# Altium footprint library PcbLib.PcbLib: 428 footprints (part 2 of 27)
Each footprint in its own frame and in the unit in brackets; x right, y up, seen from the top. Pads: shape width x height; smd on the part's side, far side on the other; paste and mask are expansions set on the pad; w line width, h text height; cw(c..) or ccw(c..) is an arc to the next point about the centre after c.
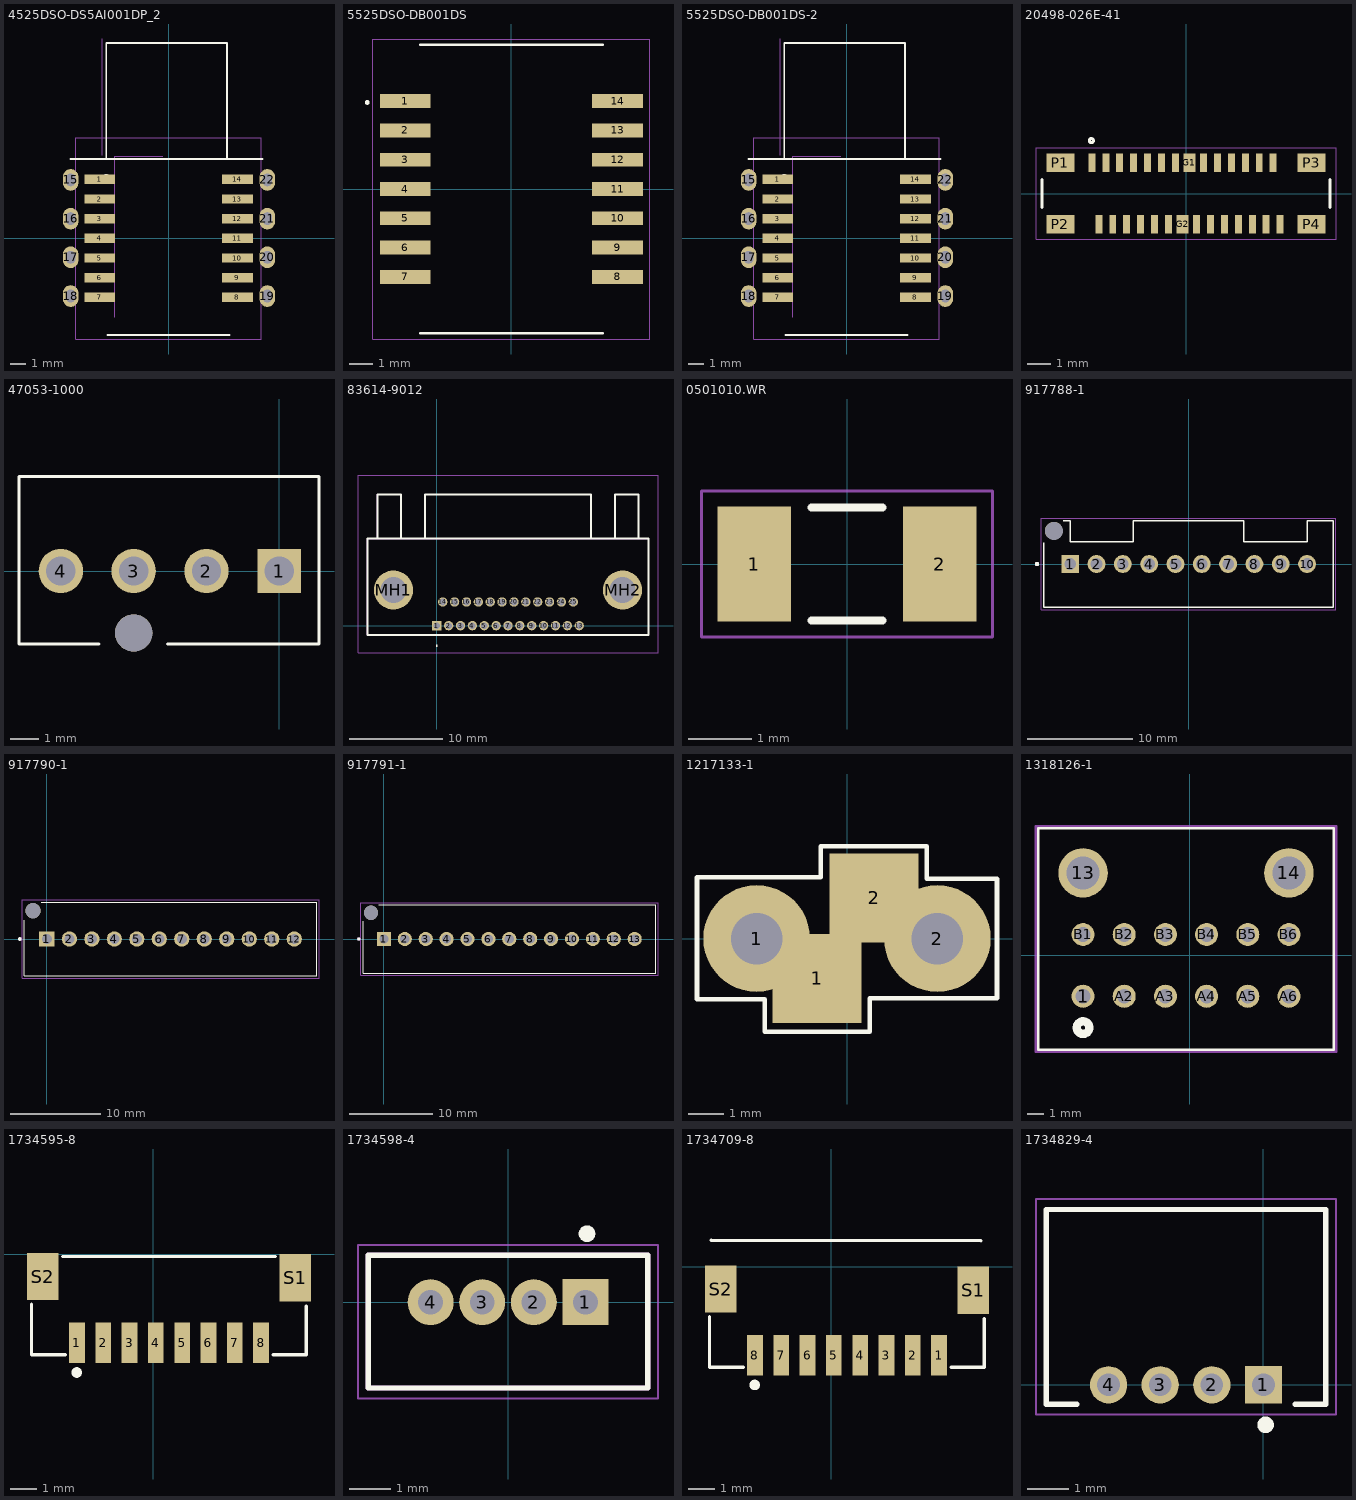
[diagram p1: the footprints below, top view; thin cyan lines are the x and y axes]

## 4525DSO-DS5AI001DP_2 [mm]
pads (22):
  rect 2x0.6 smd: 1(-4.448,3.81) 2(-4.448,2.54) 3(-4.448,1.27) 4(-4.448,0) 5(-4.448,-1.27) 6(-4.448,-2.54) 7(-4.448,-3.81) 8(4.448,-3.81) 9(4.448,-2.54) 10(4.448,-1.27) 11(4.448,0) 12(4.448,1.27) 13(4.448,2.54) 14(4.448,3.81)
  oval 1x1.4 hole 0.6 slot 0.8 at 90 deg: 15(-6.325,3.775) 16(-6.325,1.275) 17(-6.325,-1.225) 18(-6.325,-3.725) 19(6.375,-3.725) 20(6.375,-1.225) 21(6.375,1.275) 22(6.375,3.775)
Top Overlay:
  circle w0.3: c-4.041,3.902 r0.1
  circle w0.1: c-6.25,3.75 r0.05
  lines w0.127: -6.352,5.128 -4.052,5.128 ; -3.95,-6.25 3.95,-6.25 ; 6.073,5.128 3.773,5.128 ; 3.773,5.128 3.773,12.628 -4.027,12.628 -4.027,5.128 3.773,5.128
Mechanical 15:
  lines w0.05: -4.277,5.378 -4.277,12.878 ; -3.491,-5.098 -3.491,5.302 -0.391,5.302 ; -6,-6.5 6,-6.5 6,6.5 -6,6.5 -6,-6.5
3D body "4525DO-DS5AI001DP.STEP": height 8.93, standoff -2.76, extent -6.477,-4.775 6.477,12.702

## 5525DSO-DB001DS [mm]
pads (14):
  rect 2.2x0.6 smd: 1(-4.6,3.81) 2(-4.6,2.54) 3(-4.6,1.27) 4(-4.6,0) 5(-4.6,-1.27) 6(-4.6,-2.54) 7(-4.6,-3.81) 8(4.6,-3.81) 9(4.6,-2.54) 10(4.6,-1.27) 11(4.6,0) 12(4.6,1.27) 13(4.6,2.54) 14(4.6,3.81)
Top Overlay:
  circle w0.1: c-6.25,3.75 r0.05
  lines w0.127: -3.95,-6.25 3.95,-6.25 ; -3.95,6.25 3.95,6.25
Mechanical 15:
  lines w0.05: -6,-6.5 -6,6.5 6,6.5 6,-6.5 -6,-6.5
3D body "step_temp.STEP": height 9.68, standoff 0, extent -5.16,-6.226 5.16,6.274

## 5525DSO-DB001DS-2 [mm]
pads (22):
  rect 2x0.6 smd: 1(-4.448,3.81) 2(-4.448,2.54) 3(-4.448,1.27) 4(-4.448,0) 5(-4.448,-1.27) 6(-4.448,-2.54) 7(-4.448,-3.81) 8(4.448,-3.81) 9(4.448,-2.54) 10(4.448,-1.27) 11(4.448,0) 12(4.448,1.27) 13(4.448,2.54) 14(4.448,3.81)
  oval 1x1.4 hole 0.6 slot 0.8 at 90 deg: 15(-6.325,3.775) 16(-6.325,1.275) 17(-6.325,-1.225) 18(-6.325,-3.725) 19(6.375,-3.725) 20(6.375,-1.225) 21(6.375,1.275) 22(6.375,3.775)
Top Overlay:
  circle w0.3: c-4.041,3.902 r0.1
  circle w0.1: c-6.25,3.75 r0.05
  lines w0.127: -6.352,5.128 -4.052,5.128 ; -3.95,-6.25 3.95,-6.25 ; 6.073,5.128 3.773,5.128 ; 3.773,5.128 3.773,12.628 -4.027,12.628 -4.027,5.128 3.773,5.128
Mechanical 15:
  lines w0.05: -4.277,5.378 -4.277,12.878 ; -3.491,-5.098 -3.491,5.302 -0.391,5.302 ; -6,-6.5 6,-6.5 6,6.5 -6,6.5 -6,-6.5
3D body "step_temp.STEP": height 9.68, standoff 0, extent -5.16,-6.226 5.16,6.274

## 20498-026E-41 [mm]
pads (32):
  rect 0.3x0.8 smd paste-1: 1(-4.05,1.32) 2(-3.75,-1.32) 3(-3.45,1.32) 4(-3.15,-1.32) 5(-2.85,1.32) 6(-2.55,-1.32) 7(-2.25,1.32) 8(-1.95,-1.32) 9(-1.65,1.32) 10(-1.35,-1.32) 11(-1.05,1.32) 12(-0.75,-1.32) 13(-0.45,1.32) 14(0.45,-1.32) 15(0.75,1.32) 16(1.05,-1.32) 17(1.35,1.32) 18(1.65,-1.32) 19(1.95,1.32) 20(2.25,-1.32) 21(2.55,1.32) 22(2.85,-1.32) 23(3.15,1.32) 24(3.45,-1.32) 25(3.75,1.32) 26(4.05,-1.32)
  rect 0.5x0.8 smd paste-1: G1(0.15,1.32) G2(-0.15,-1.32)
  rect 1.2x0.8 smd paste-2: P1(-5.4,1.32) P2(-5.4,-1.32) P3(5.4,1.32) P4(5.4,-1.32)
Top Overlay:
  circle w0.127: c-4.07,2.28 r0.089
  lines w0.127: -6.2,-0.6 -6.2,0.6 ; 6.2,-0.6 6.2,0.6
Top Paste:
  region: -4.8,1.08 -6,1.08 -6,1.72 -4.8,1.72
  region: -4.8,-1.72 -6,-1.72 -6,-1.08 -4.8,-1.08
  region: -3.9,1.24 -4.2,1.24 -4.2,1.72 -3.9,1.72
  region: -3.6,-1.72 -3.9,-1.72 -3.9,-1.24 -3.6,-1.24
  region: 0.1,-1.72 -0.4,-1.72 -0.4,-1.08 0.1,-1.08
  region: 0.4,1.08 -0.1,1.08 -0.1,1.72 0.4,1.72
  region: -3,-1.72 -3.3,-1.72 -3.3,-1.24 -3,-1.24
  region: -2.4,-1.72 -2.7,-1.72 -2.7,-1.24 -2.4,-1.24
  region: -1.8,-1.72 -2.1,-1.72 -2.1,-1.24 -1.8,-1.24
  region: -1.2,-1.72 -1.5,-1.72 -1.5,-1.24 -1.2,-1.24
  region: -0.6,-1.72 -0.9,-1.72 -0.9,-1.24 -0.6,-1.24
  region: 0.6,-1.72 0.3,-1.72 0.3,-1.24 0.6,-1.24
  region: 1.2,-1.72 0.9,-1.72 0.9,-1.24 1.2,-1.24
  region: 1.8,-1.72 1.5,-1.72 1.5,-1.24 1.8,-1.24
  region: 2.4,-1.72 2.1,-1.72 2.1,-1.24 2.4,-1.24
  region: 3,-1.72 2.7,-1.72 2.7,-1.24 3,-1.24
  region: 3.6,-1.72 3.3,-1.72 3.3,-1.24 3.6,-1.24
  region: 4.2,-1.72 3.9,-1.72 3.9,-1.24 4.2,-1.24
  region: -3.3,1.24 -3.6,1.24 -3.6,1.72 -3.3,1.72
  region: -2.7,1.24 -3,1.24 -3,1.72 -2.7,1.72
  region: -2.1,1.24 -2.4,1.24 -2.4,1.72 -2.1,1.72
  region: -1.5,1.24 -1.8,1.24 -1.8,1.72 -1.5,1.72
  region: -0.9,1.24 -1.2,1.24 -1.2,1.72 -0.9,1.72
  region: -0.3,1.24 -0.6,1.24 -0.6,1.72 -0.3,1.72
  region: 0.9,1.24 0.6,1.24 0.6,1.72 0.9,1.72
  region: 1.5,1.24 1.2,1.24 1.2,1.72 1.5,1.72
  region: 2.1,1.24 1.8,1.24 1.8,1.72 2.1,1.72
  region: 2.7,1.24 2.4,1.24 2.4,1.72 2.7,1.72
  region: 3.3,1.24 3,1.24 3,1.72 3.3,1.72
  region: 3.9,1.24 3.6,1.24 3.6,1.72 3.9,1.72
  region: 6,-1.72 4.8,-1.72 4.8,-1.08 6,-1.08
  region: 6,1.08 4.8,1.08 4.8,1.72 6,1.72
Mechanical 15:
  lines w0.05: -6.45,-1.97 6.45,-1.97 6.45,1.97 -6.45,1.97 -6.45,-1.97
3D body "20498-026E-41--3DModel-STEP-231308.STEP": height 1.24, standoff -0.03, extent -6.2,-1.45 6.2,1.45

## 47053-1000 [mm]
pads (5):
  rect 1.53x1.53 hole 1.02: 1(0,0)
  round 1.55 hole 1.02: 2(-2.54,0) 3(-5.08,0) 4(-7.62,0)
  round 1.3 hole 1.3 unplated: ""(-5.08,-2.16)
Top Overlay:
  lines w0.1: -6.293,-2.54 -9.08,-2.54 -9.08,3.3 1.386,3.3 1.386,-2.54 -3.902,-2.54
3D body "470531000.stp": height 10.5, standoff -3, extent -8.93,-2.54 1.27,3.3

## 83614-9012 [mm]
pads (27):
  rect 1x1 hole 0.71: 1(0,0)
  round 1 hole 0.71: 2(1.27,0) 3(2.54,0) 4(3.81,0) 5(5.08,0) 6(6.35,0) 7(7.62,0) 8(8.89,0) 9(10.16,0) 10(11.43,0) 11(12.7,0) 12(13.97,0) 13(15.24,0) 14(0.635,2.54) 15(1.905,2.54) 16(3.175,2.54) 17(4.445,2.54) 18(5.715,2.54) 19(6.985,2.54) 20(8.255,2.54) 21(9.525,2.54) 22(10.795,2.54) 23(12.065,2.54) 24(13.335,2.54) 25(14.605,2.54)
  round 4.185 hole 2.79: MH1(-4.635,3.81) MH2(19.875,3.81)
Top Overlay:
  lines w0.1: 0,-2.2 ccw(c0,-2.15) 0,-2.1 ccw(c0,-2.15) 0,-2.2
  lines w0.2: -6.35,9.32 -6.35,14.04 -3.81,14.04 -3.81,9.32 ; -1.27,9.32 -1.27,14.04 16.51,14.04 16.51,9.32 ; 19.05,9.32 19.05,14.04 21.59,14.04 21.59,9.32 ; -7.43,-0.98 22.67,-0.98 22.67,9.32 -7.43,9.32 -7.43,-0.98
Mechanical 13:
  lines w0.1: -6.35,9.32 -6.35,14.04 -3.81,14.04 -3.81,9.32 ; -1.27,9.32 -1.27,14.04 16.51,14.04 16.51,9.32 ; 19.05,9.32 19.05,14.04 21.59,14.04 21.59,9.32 ; -7.43,-0.98 22.67,-0.98 22.67,9.32 -7.43,9.32 -7.43,-0.98
Mechanical 15:
  lines w0.1: -8.43,-2.9 23.67,-2.9 23.67,16.1 -8.43,16.1 -8.43,-2.9
3D body "836149012.stp": height 7.91, standoff -2.95, extent -7.41,-1.014 22.689,15.852

## 0501010.WR [mm]
pads (2):
  rect 1.17x1.82 smd: 1(-1.47,0) 2(1.47,0)
Top Overlay:
  lines w0.127: -0.56,-0.9 0.56,-0.9 ; -0.56,0.9 0.56,0.9
Mechanical 15:
  lines w0.05: -2.308,-1.158 2.308,-1.158 2.308,1.158 -2.308,1.158 -2.308,-1.158
3D body "0501010.WR.STEP": height 1.52, standoff 0, extent -1.587,-0.902 1.587,0.902

## 917788-1 [mm]
pads (11):
  rect 1.7x1.7 hole 1.1: 1(-11.25,0)
  round 1.7 hole 1.1: 2(-8.75,0) 3(-6.25,0) 4(-3.75,0) 5(-1.25,0) 6(1.25,0) 7(3.75,0) 8(6.25,0) 9(8.75,0) 10(11.25,0)
  round 1.7 hole 1.7 unplated: ""(-12.8,3.15)
Top Overlay:
  circle w0.2: c-14.4,0 r0.1
  lines w0.127: -13.75,2 -13.75,-4.1 13.75,-4.1 13.75,4.1 11.25,4.1 11.25,2.1 5.25,2.1 5.25,4.1 -5.25,4.1 -5.25,2.1 -11.25,2.1 -11.25,4.1 -11.9,4.1
Mechanical 13:
  circle w0.2: c-14.4,0 r0.1
Mechanical 15:
  lines w0.05: -14,-4.35 14,-4.35 14,4.35 -14,4.35 -14,-4.35
3D body "c-917788-1-j-3d.stp": height 10.1, standoff -2.9, extent -13.75,-4.1 13.75,4.1

## 917790-1 [mm]
pads (13):
  rect 1.7x1.7 hole 1.1: 1(0,0)
  round 1.7 hole 1.1: 2(2.5,0) 3(5,0) 4(7.5,0) 5(10,0) 6(12.5,0) 7(15,0) 8(17.5,0) 9(20,0) 10(22.5,0) 11(25,0) 12(27.5,0)
  round 1.7 hole 1.7 unplated: ""(-1.55,3.15)
Top Overlay:
  circle w0.2: c-3,0 r0.1
  lines w0.127: -2.5,2.1 -2.5,-4.1 30,-4.1 30,4.1 -0.6,4.1
Mechanical 13:
  circle w0.2: c-3,0 r0.1
Mechanical 15:
  lines w0.05: -2.75,-4.35 30.25,-4.35 30.25,4.35 -2.75,4.35 -2.75,-4.35
3D body "c-917790-1-l-3d.stp": height 10.1, standoff -2.9, extent -2.534,-4.1 29.966,4.1

## 917791-1 [mm]
pads (14):
  rect 1.7x1.7 hole 1.1: 1(0,0)
  round 1.7 hole 1.1: 2(2.5,0) 3(5,0) 4(7.5,0) 5(10,0) 6(12.5,0) 7(15,0) 8(17.5,0) 9(20,0) 10(22.5,0) 11(25,0) 12(27.5,0) 13(30,0)
  round 1.7 hole 1.7 unplated: ""(-1.55,3.15)
Top Overlay:
  circle w0.2: c-3,0 r0.1
  lines w0.127: -2.5,2.1 -2.5,-4.1 32.512,-4.1 32.512,4.1 -0.6,4.1
Mechanical 13:
  circle w0.2: c-3,0 r0.1
Mechanical 15:
  lines w0.05: -2.75,-4.35 32.791,-4.35 32.791,4.35 -2.75,4.35 -2.75,-4.35
3D body "917791-1.stp": height 10.1, standoff -2.9, extent -2.5,-4.1 32.5,4.1

## 1217133-1 [mm]
pads (4):
  round 3 hole 1.45: 1(-2.54,0) 2(2.54,0)
  rect 2.5x2.5 smd: 1(-0.838,-1.118) 2(0.762,1.143)
Top Overlay:
  lines w0.127: -4.216,-1.702 -4.216,1.727 -1.499,1.727 -0.737,1.727 -0.737,2.591 2.235,2.591 2.235,1.676 4.216,1.676 4.216,-1.676 0.635,-1.676 0.635,-2.616 -2.311,-2.616 -2.311,-1.702 -4.216,-1.702
3D body "step_temp.STEP": height 9, standoff -3.45, extent -3.962,-1.537 3.962,1.537

## 1318126-1 [mil]
pads (14):
  round 55 / inner round 60 / far side round 55 hole 35 paste-99999 mask+0: 1(-254.72,-97.87) A2(-156.3,-97.87) A3(-57.87,-97.87) A4(40.55,-97.87) A5(138.98,-97.87) A6(237.4,-97.87) B1(-254.72,49.76) B2(-156.3,49.76) B3(-57.87,49.76) B4(40.55,49.76) B5(138.98,49.76) B6(237.4,49.76)
  round 118.11 hole 78.74 paste-99999 mask-52.5: 13(-254.72,196.94) 14(237.34,196.94)
Top Overlay:
  circle w20: c-254.72,-172.87 r15
  lines w6: -362.16,-226.06 -362.16,303.94 344.84,303.94 344.84,-226.06 -362.16,-226.06
Bottom Overlay:
  circle w20: c-254.72,-172.87 r15
  text "6" at 319,31 h50
  text "1" at -314,30 h50
Mechanical 15:
  lines w6: -367.16,-231.06 -367.16,308.94 349.84,308.94 349.84,-231.06 -367.16,-231.06
3D body "c-1318126-1-e-3d.stp": height 700, standoff -138.19, extent -358.15,-217.72 338.7,302.76

## 1734595-8 [mm]
pads (10):
  rect 0.6x1.55 smd: 1(-2.895,-3.37) 2(-1.895,-3.37) 3(-0.895,-3.37) 4(0.105,-3.37) 5(1.105,-3.37) 6(2.105,-3.37) 7(3.105,-3.37) 8(4.105,-3.37)
  rect 1.2x1.8 smd: S1(5.41,-0.9) S2(-4.2,-0.85)
Top Overlay:
  circle w0.2: c-2.91,-4.5 r0.1
  lines w0.127: -4.626,-1.9 -4.626,-3.82 -3.33,-3.82 ; -3.43,-0.086 4.65,-0.086 ; 4.56,-3.821 5.82,-3.821 5.82,-1.98
3D body "1734595-8.stp": height 4.5, standoff 0.2, extent -4.55,-3.75 5.75,-0.15

## 1734598-4 [mm]
pads (4):
  rect 1.108x1.108 hole 0.6: 1(1.867,0)
  round 1.108 hole 0.6: 2(0.622,0) 3(-0.622,0) 4(-1.867,0)
Top Overlay:
  circle w0.2: c1.905,1.651 r0.1
  lines w0.127: -3.367,-2.07 3.367,-2.07 3.367,1.13 -3.367,1.13 -3.367,-2.07
Mechanical 13:
  lines w0.127: -3.367,-2.07 3.367,-2.07 3.367,1.13 -3.367,1.13 -3.367,-2.07
Mechanical 15:
  lines w0.05: -3.617,-2.32 3.617,-2.32 3.617,1.38 -3.617,1.38 -3.617,-2.32
3D body "1734598-4.stp": height 4.75, standoff -1.65, extent -3.375,-2.108 3.375,1.092

## 1734709-8 [mm]
pads (10):
  rect 0.6x1.55 smd: 1(4.105,-3.37) 2(3.105,-3.37) 3(2.105,-3.37) 4(1.105,-3.37) 5(0.105,-3.37) 6(-0.895,-3.37) 7(-1.895,-3.37) 8(-2.895,-3.37)
  rect 1.2x1.8 smd: S1(5.41,-0.9) S2(-4.2,-0.85)
Top Overlay:
  circle w0.2: c-2.91,-4.5 r0.1
  lines w0.127: -4.626,-1.9 -4.626,-3.82 -3.33,-3.82 ; -4.56,1 5.7,0.98 ; 4.56,-3.821 5.82,-3.821 5.82,-1.98
3D body "c-1734709-8-b-3d.stp": height 2.95, standoff 0, extent -4.55,-4.06 5.75,0.89

## 1734829-4 [mm]
pads (4):
  rect 0.9x0.9 hole 0.55: 1(0,0)
  round 0.9 hole 0.55: 2(-1.245,0) 3(-2.489,0) 4(-3.734,0)
Top Overlay:
  circle w0.2: c0.051,-0.965 r0.1
  lines w0.127: -4.504,-0.47 -5.234,-0.47 -5.234,4.23 1.5,4.23 1.5,-0.47 0.77,-0.47
Mechanical 15:
  lines w0.05: -5.484,-0.72 1.75,-0.72 1.75,4.48 -5.484,4.48 -5.484,-0.72
3D body "1734829-4.stp": height 3.35, standoff -2.15, extent -5.255,-0.457 1.495,4.243